# Altium footprint library 封装库.PcbLib: 755 footprints (part 47 of 48)
Each footprint in its own frame and in the unit in brackets; x right, y up, seen from the top. Pads: shape width x height; smd on the part's side, far side on the other; paste and mask are expansions set on the pad; w line width, h text height; cw(c..) or ccw(c..) is an arc to the next point about the centre after c.
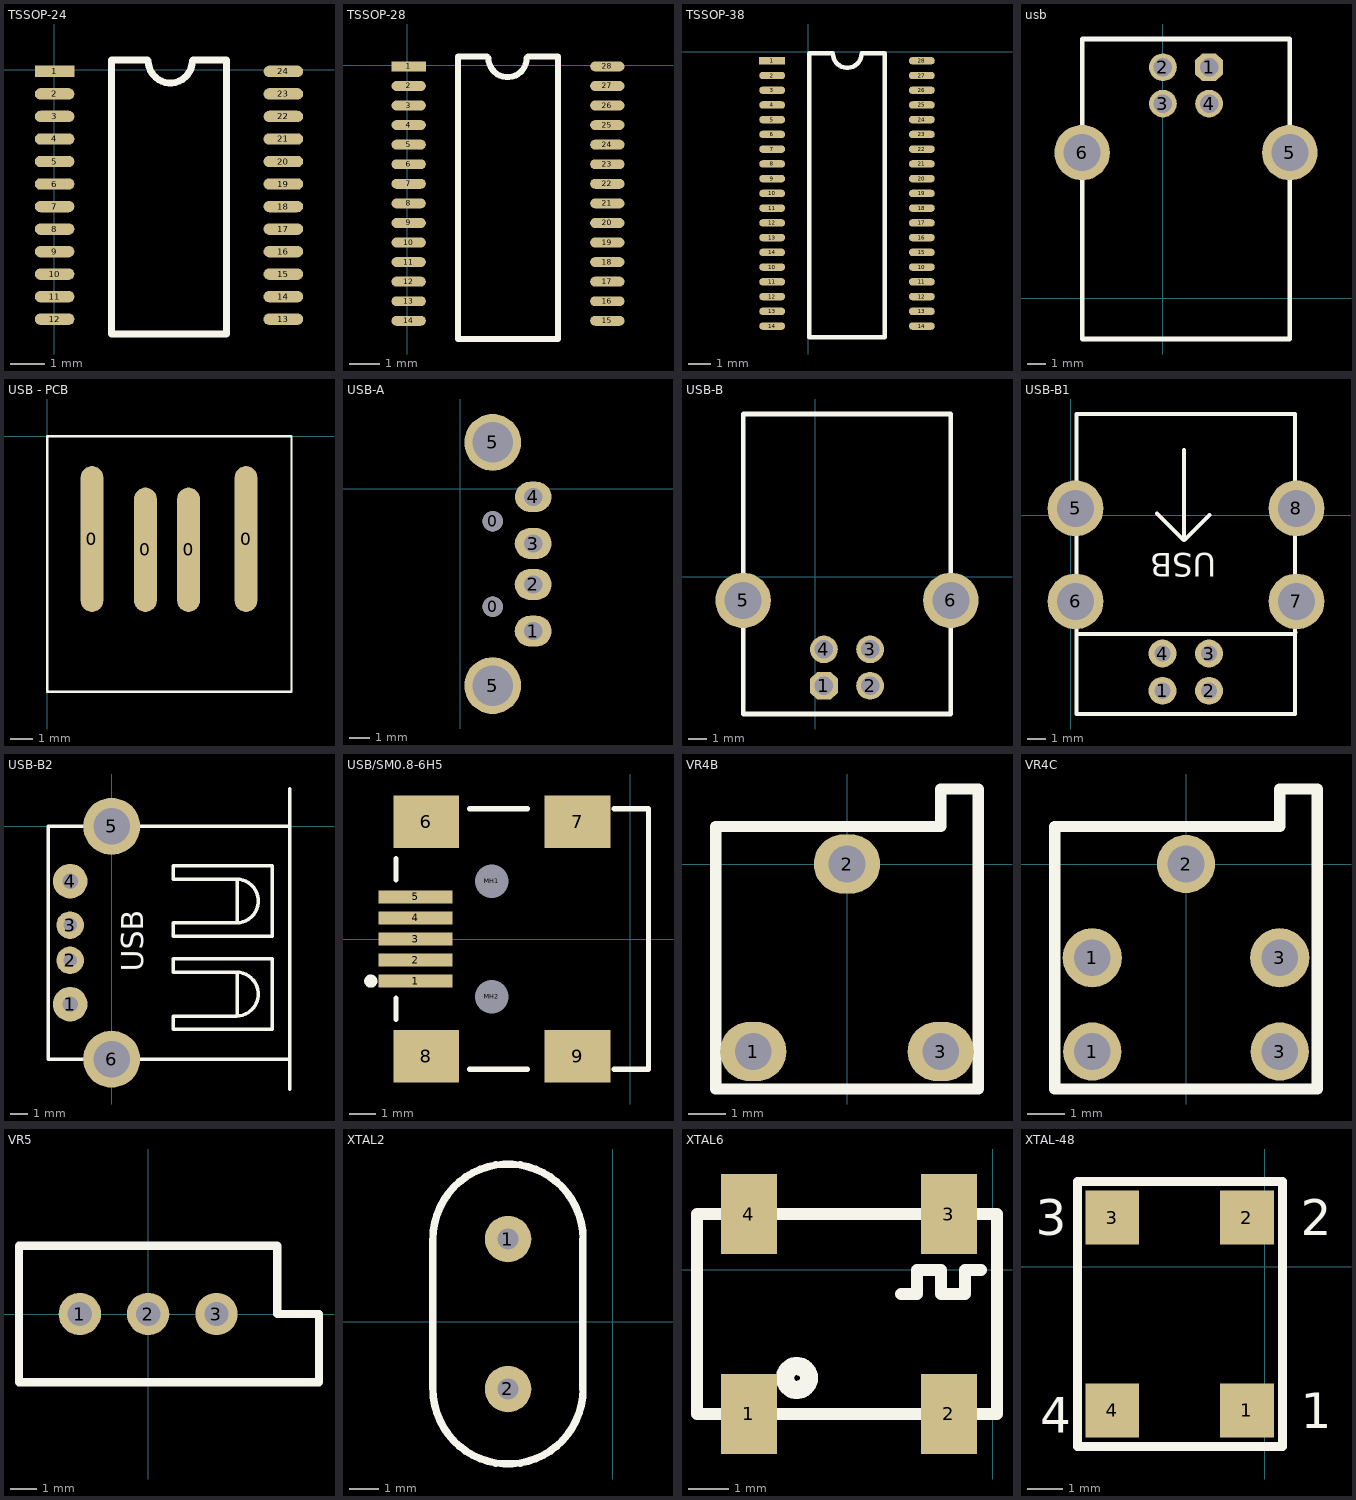
[diagram p46: the footprints below, top view; thin cyan lines are the x and y axes]

## TSSOP-24 [mm]
pads (24):
  rect 1.143x0.33 smd: 1(0.016,-0.046)
  oval 1.143x0.33 smd: 2(0.016,-0.696) 3(0.016,-1.346) 4(0.016,-1.996) 5(0.016,-2.646) 6(0.016,-3.296) 7(0.016,-3.946) 8(0.016,-4.596) 9(0.016,-5.246) 10(0.016,-5.896) 11(0.016,-6.546) 12(0.016,-7.196) 13(6.616,-7.196) 14(6.616,-6.546) 15(6.616,-5.896) 16(6.616,-5.246) 17(6.616,-4.596) 18(6.616,-3.946) 19(6.616,-3.296) 20(6.616,-2.646) 21(6.616,-1.996) 22(6.616,-1.346) 23(6.616,-0.696) 24(6.616,-0.046)
Top Overlay:
  lines w0.2: 2.692,0.279 1.651,0.279 1.651,-7.62 4.981,-7.62 4.981,0.279 4.013,0.279 ; 2.718,0.254 ccw(c3.353,0.254) 3.988,0.254

## TSSOP-28 [mm]
pads (28):
  rect 1.143x0.33 smd: 1(0.041,-0.046)
  oval 1.143x0.33 smd: 2(0.041,-0.696) 3(0.041,-1.346) 4(0.041,-1.996) 5(0.041,-2.646) 6(0.041,-3.296) 7(0.041,-3.946) 8(0.041,-4.596) 9(0.041,-5.246) 10(0.041,-5.896) 11(0.041,-6.546) 12(0.041,-7.196) 13(0.041,-7.846) 14(0.041,-8.496) 15(6.641,-8.496) 16(6.641,-7.846) 17(6.641,-7.196) 18(6.641,-6.546) 19(6.641,-5.896) 20(6.641,-5.246) 21(6.641,-4.596) 22(6.641,-3.946) 23(6.641,-3.296) 24(6.641,-2.646) 25(6.641,-1.996) 26(6.641,-1.346) 27(6.641,-0.696) 28(6.641,-0.046)
Top Overlay:
  lines w0.2: 2.642,0.279 1.676,0.279 1.676,-9.1 5.006,-9.1 5.006,0.279 4.013,0.279 ; 2.692,0.229 ccw(c3.327,0.229) 3.962,0.229

## TSSOP-38 [mm]
pads (38):
  rect 1.143x0.33 smd: 1(-1.584,-0.401)
  oval 1.143x0.33 smd: 2(-1.584,-1.051) 3(-1.584,-1.701) 4(-1.584,-2.351) 5(-1.584,-3.001) 6(-1.584,-3.651) 7(-1.584,-4.301) 8(-1.584,-4.951) 9(-1.584,-5.601) 10(-1.584,-9.501) 10(-1.584,-6.251) 10(5.016,-9.501) 11(-1.584,-10.151) 11(-1.584,-6.901) 11(5.016,-10.151) 12(-1.584,-10.801) 12(-1.584,-7.551) 12(5.016,-10.801) 13(-1.584,-11.451) 13(-1.584,-8.201) 13(5.016,-11.451) 14(-1.584,-12.101) 14(-1.584,-8.851) 14(5.016,-12.101) 15(5.016,-8.851) 16(5.016,-8.201) 17(5.016,-7.551) 18(5.016,-6.901) 19(5.016,-6.251) 20(5.016,-5.601) 21(5.016,-4.951) 22(5.016,-4.301) 23(5.016,-3.651) 24(5.016,-3.001) 25(5.016,-2.351) 26(5.016,-1.701) 27(5.016,-1.051) 28(5.016,-0.401)
Top Overlay:
  lines w0.2: 0.051,-12.6 0.051,-0.076 1.092,-0.076 ccw(c1.727,-0.076) 2.362,-0.076 3.381,-0.076 3.381,-12.6 0.051,-12.6

## usb [mil]
pads (6):
  oct 60x60 hole 40: 1(99.98,500.85)
  round 60 hole 40: 2(-0.02,500.85) 3(-0.02,422.11) 4(99.98,422.11)
  round 120 hole 80: 5(274.98,315.81) 6(-175.02,315.81)
Top Overlay:
  lines w10: -175.02,-87.89 274.98,-87.89 274.98,562.11 -175.02,562.11 -175.02,-87.89

## USB - PCB [mm]
pads (4):
  oval 1x6.452 smd: 0(1.981,-4.547) 0(8.788,-4.547)
  oval 1x5.5 smd: 0(4.343,-5.023) 0(6.248,-5.023)
Top Overlay:
  lines w0.1: 0,-11.303 10.795,-11.303 10.795,0 0,0 0,-11.303

## USB-A [mm]
pads (8):
  round 1 hole 1: 0(1.607,-5.81) 0(1.607,-1.592)
  oval 1.824x1.524 hole 0.9: 1(3.607,-7.01) 2(3.607,-4.71) 3(3.607,-2.692)
  oval 1.8x1.5 hole 0.9: 4(3.607,-0.392)
  round 2.8 hole 2: 5(1.607,2.299) 5(1.607,-9.701)

## USB-B [mil]
height 68.11
pads (6):
  oct 60x60 hole 40: 1(18.39,-235.84)
  round 60 hole 40: 2(118.39,-235.84) 3(118.39,-157.1) 4(18.39,-157.1)
  round 120 hole 80: 5(-156.61,-50.8) 6(293.39,-50.8)
Top Overlay:
  lines w10: -156.61,-297.1 293.39,-297.1 293.39,352.9 -156.61,352.9 -156.61,-297.1

## USB-B1 [mil]
pads (8):
  round 60 hole 35: 1(197,-377) 2(297,-377) 3(297,-297) 4(197,-297)
  round 120 hole 80: 5(10,15) 6(10,-185) 7(485,-185) 8(485,15)
Top Overlay:
  lines w8: 12,-255 482,-255 483,-251 ; 185,4 241,-52 ; 243,-53 243,141 ; 244,-53 298,1 ; 12,-427 12,218 482,218 482,-427 12,-427
  text "USB" at 312,-81 h50

## USB-B2 [mil]
pads (6):
  round 78.74 hole 35.43: 1(-94.49,-405) 4(-94.49,-125)
  round 62.99 hole 31.5: 2(-94.49,-305) 3(-94.49,-225)
  round 129.92 hole 82.68: 5(0,0) 6(0,-530)
Top Overlay:
  lines w8: 285.51,-430 285.51,-334 ; 285.51,-218 285.51,-122 ; 405.51,-598 405.51,85 ; 405.51,-530 -144.49,-530 -144.49,0 405.51,0 ; 140.51,-462 365.51,-462 365.51,-302 140.51,-302 140.51,-332 284.3,-332 cw(c283.77,-382) 284.3,-432 140.51,-432 140.51,-462 ; 140.51,-250 365.51,-250 365.51,-90 140.51,-90 140.51,-120 284.3,-120 cw(c283.77,-170) 284.3,-220 140.51,-220 140.51,-250
  text "USB" at 71.51,-331 h50

## USB/SM0.8-6H5 [mm]
pads (11):
  rect 2.8x0.5 smd: 1(-8.155,-1.6) 2(-8.155,-0.8) 3(-8.155,0) 4(-8.155,0.8) 5(-8.155,1.6)
  rect 2.5x2 smd: 6(-7.75,4.45) 7(-1.996,4.45) 8(-7.75,-4.45) 9(-1.996,-4.45)
  round 0.6 hole 1.27 unplated: MH1(-5.25,2.2) MH2(-5.25,-2.2)
Top Overlay:
  circle w0.25: c-9.855,-1.6 r0.125
  lines w0.2: -8.9,-3.05 -8.9,-2.25 ; -8.9,2.25 -8.9,3.05 ; -6.1,-4.95 -3.9,-4.95 ; -6.1,4.95 -3.9,4.95 ; -0.6,-4.95 0.7,-4.95 0.7,4.95 -0.6,4.95

## VR4B [mm]
pads (3):
  oval 1.8x1.6 hole 1: 1(-2.54,-5.08) 2(0,0) 3(2.54,-5.08)
Top Overlay:
  lines w0.305: -3.556,-6.096 3.556,-6.096 3.556,2.032 2.54,2.032 2.54,1.016 -3.556,1.016 -3.556,-6.096

## VR4C [mm]
pads (5):
  round 1.575 hole 1: 1(-2.54,-5.08) 2(0,0) 3(2.54,-5.08)
  round 1.6 hole 1: 1(-2.54,-2.54) 3(2.54,-2.54)
Top Overlay:
  lines w0.305: -3.556,-6.096 -3.556,1.016 2.54,1.016 2.54,2.032 3.556,2.032 3.556,-6.096 -3.556,-6.096

## VR5 [mil]
pads (3):
  round 62 hole 35.43: 1(-100,0) 2(0,0) 3(100,0)
Top Overlay:
  lines w12: -188.98,-100 250,-100 250,0 188.98,0 188.98,100 -188.98,100 -188.98,-100

## XTAL2 [mil]
pads (2):
  round 62 hole 28: 1(-140,110) 2(-140,-90)
Top Overlay:
  lines w10: -240,-90 ccw(c-140,-90) -40,-90 -40,110 ccw(c-140,110) -240,110 -240,-90

## XTAL6 [mm]
pads (4):
  rect 1.4x2 smd: 1(-6.096,-3.603) 2(-1.096,-3.603) 3(-1.096,1.397) 4(-6.096,1.397)
Top Overlay:
  circle w0.254: c-4.896,-2.703 r0.2
  circle w0.254: c-4.896,-2.703 r0.4
  lines w0.305: -2.296,-0.603 -1.896,-0.603 -1.896,-0.003 -1.296,-0.003 -1.296,-0.603 -0.796,-0.603 -0.696,-0.603 -0.696,-0.003 -0.296,-0.003 ; -7.396,-3.603 0.104,-3.603 0.104,1.397 -7.396,1.397 -7.396,-3.603
Multi-Layer:
  text "Comment" at -7.548,2.6 h0.64

## XTAL-48 [mil]
pads (4):
  rect 60x60 smd: 1(-20,-160) 2(-20,55) 3(-170,55) 4(-170,-160)
Top Overlay:
  lines w10: -208.71,-200 -208.71,95 -5,95 20,95 20,-200 -8.1,-200 -208.71,-200
  text "1" at 40,-180 h39.37
  text "2" at 40,35 h39.37
  text "3" at -255,35 h39.37
  text "4" at -250,-185 h39.37